# Altium footprint library ICs_JEDEC.PcbLib: 13 footprints
Each footprint in its own frame and in the unit in brackets; x right, y up, seen from the top. Pads: shape width x height; smd on the part's side, far side on the other; paste and mask are expansions set on the pad; w line width, h text height; cw(c..) or ccw(c..) is an arc to the next point about the centre after c.
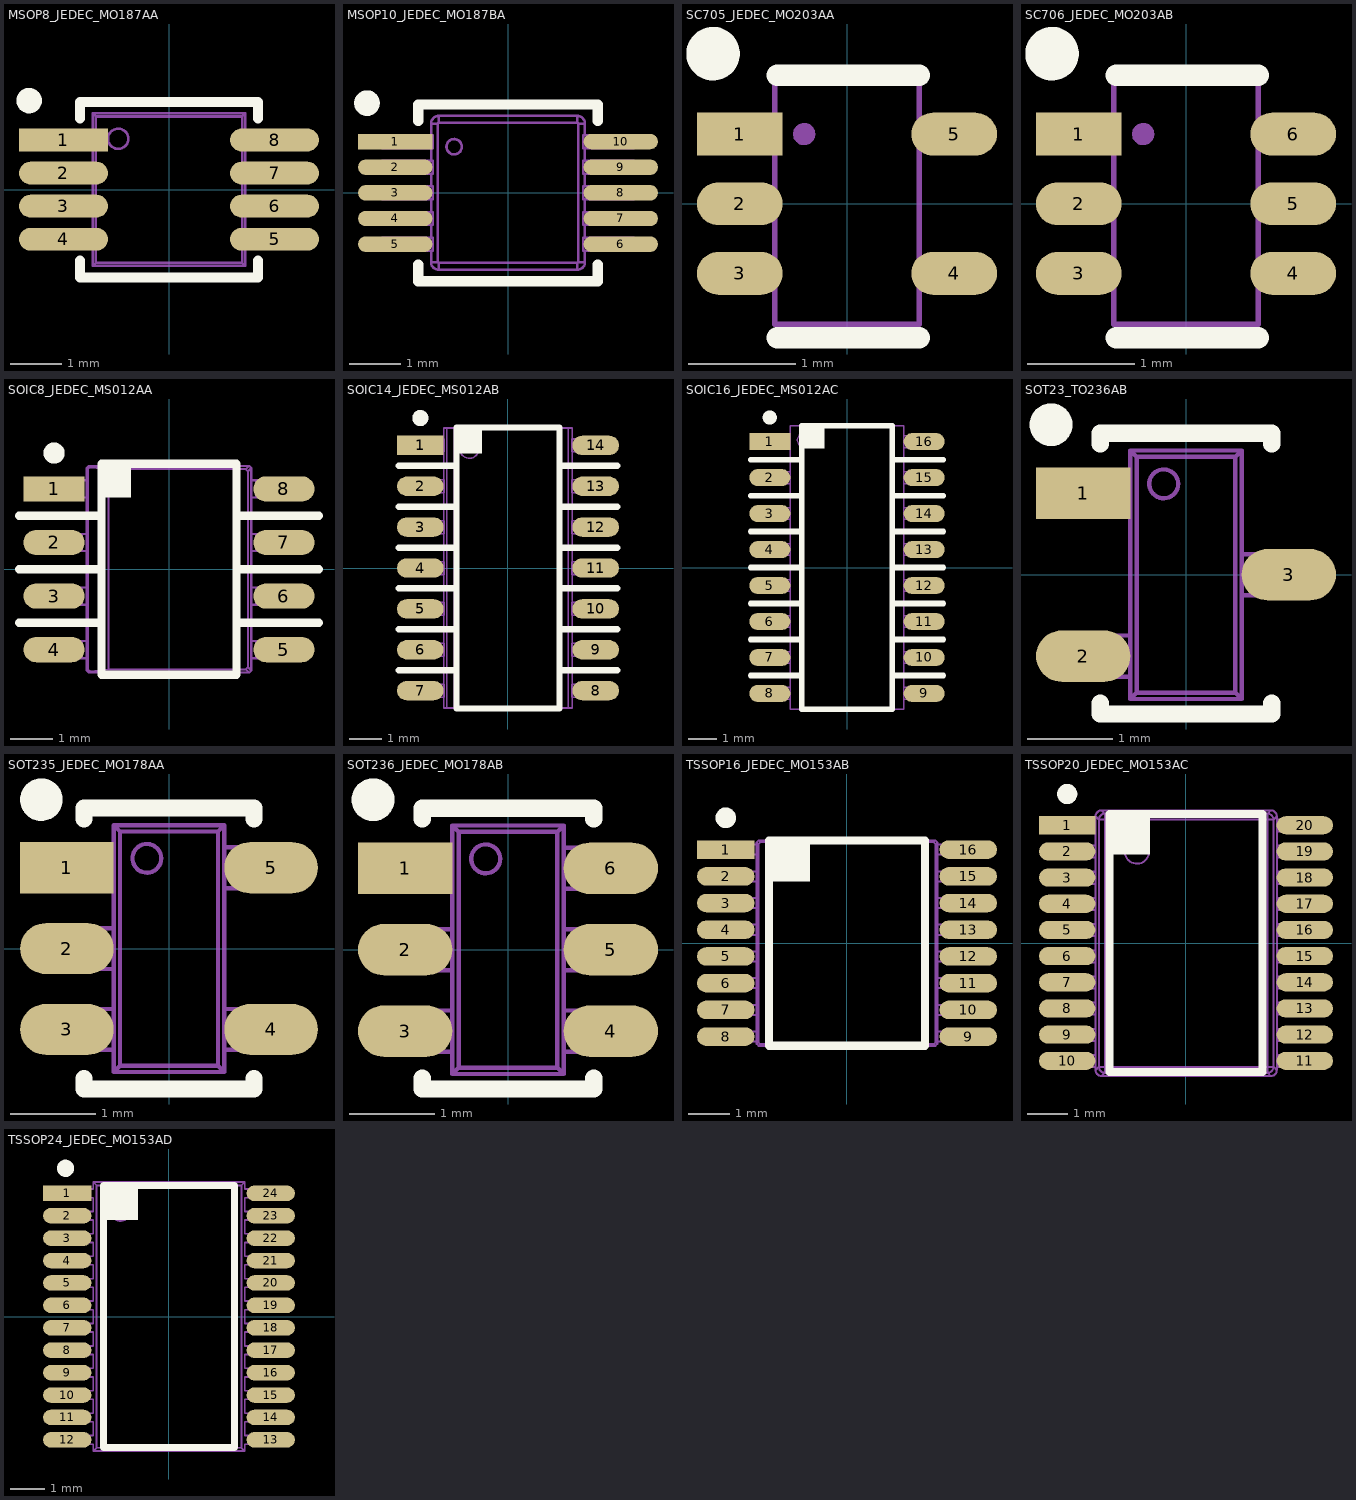
[diagram p0: the footprints below, top view; thin cyan lines are the x and y axes]

## MSOP8_JEDEC_MO187AA [mm] "MSOP, 8-Leads, Body 3.00x3.00mm, Pitch 0.65mm"
height 0.85
pads (8):
  rect 1.75x0.45 smd paste+0 mask+0.05: 1(-2.075,0.975)
  oval 1.75x0.45 smd paste+0 mask+0.05: 2(-2.075,0.325) 3(-2.075,-0.325) 4(-2.075,-0.975) 5(2.075,-0.975) 6(2.075,-0.325) 7(2.075,0.325) 8(2.075,0.975)
Top Overlay:
  circle w0.25: c-2.75,1.75 r0.125
  lines w0.2: -1.75,-1.4 -1.75,-1.725 1.75,-1.725 1.75,-1.4 ; -1.75,1.4 -1.75,1.725 1.75,1.725 1.75,1.4
Top Assembly:
  circle w0.05: c-1,1 r0.2
  lines w0.05: -2.1,-1.125 -2.5,-1.125 -2.5,-0.825 -2.1,-0.825 ; -2.1,-1.125 -2.1,-0.825 ; -2.1,-1.125 -2,-1.125 ; -2.1,-0.825 -2,-0.825 ; -2.1,-0.475 -2.5,-0.475 -2.5,-0.175 -2.1,-0.175 ; -2.1,-0.475 -2.1,-0.175 ; -2.1,-0.475 -2,-0.475 ; -2.1,-0.175 -2,-0.175 ; -2.1,0.175 -2.5,0.175 -2.5,0.475 -2.1,0.475 ; -2.1,0.175 -2.1,0.475 ; -2.1,0.175 -2,0.175 ; -2.1,0.475 -2,0.475 ; -2.1,0.825 -2.5,0.825 -2.5,1.125 -2.1,1.125 ; -2.1,0.825 -2.1,1.125 ; -2.1,0.825 -2,0.825 ; -2.1,1.125 -2,1.125 ; -2,-1.125 -2,-0.825 ; -2,-1.125 -1.8,-1.125 ; -2,-0.825 -1.8,-0.825 ; -2,-0.475 -2,-0.175 ; -2,-0.475 -1.8,-0.475 ; -2,-0.175 -1.8,-0.175 ; -2,0.175 -2,0.475 ; -2,0.175 -1.8,0.175 ; -2,0.475 -1.8,0.475 ; -2,0.825 -2,1.125 ; -2,0.825 -1.8,0.825 ; -2,1.125 -1.8,1.125 ; -1.8,-1.125 -1.5,-1.125 ; -1.8,-1.125 -1.8,-0.825 ; -1.8,-0.825 -1.5,-0.825 ; -1.8,-0.475 -1.5,-0.475 ; -1.8,-0.475 -1.8,-0.175 ; -1.8,-0.175 -1.5,-0.175 ; -1.8,0.175 -1.5,0.175 ; -1.8,0.175 -1.8,0.475 ; -1.8,0.475 -1.5,0.475 ; -1.8,0.825 -1.5,0.825 ; -1.8,0.825 -1.8,1.125 ; -1.8,1.125 -1.5,1.125 ; -1.5,-1.5 -1.5,-1.125 ; -1.5,-1.5 -1.438,-1.438 ; -1.5,-1.5 1.5,-1.5 ; -1.5,-1.125 -1.5,-0.825 ; -1.5,-0.825 -1.5,-0.475 ; -1.5,-0.475 -1.5,-0.175 ; -1.5,-0.175 -1.5,0.175 ; -1.5,0.175 -1.5,0.475 ; -1.5,0.475 -1.5,0.825 ; -1.5,0.825 -1.5,1.125 ; -1.5,1.125 -1.5,1.5 ; -1.5,1.5 -1.438,1.438 ; -1.5,1.5 1.5,1.5 ; -1.438,-1.438 -1.438,1.438 ; -1.438,-1.438 1.438,-1.438 ; -1.438,1.438 1.438,1.438 ; 1.438,-1.438 1.5,-1.5 ; 1.438,-1.438 1.438,1.438 ; 1.438,1.438 1.5,1.5 ; 1.5,-1.5 1.5,-1.125 ; 1.5,-1.125 1.5,-0.825 ; 1.5,-1.125 1.8,-1.125 ; 1.5,-0.825 1.5,-0.475 ; 1.5,-0.825 1.8,-0.825 ; 1.5,-0.475 1.5,-0.175 ; 1.5,-0.475 1.8,-0.475 ; 1.5,-0.175 1.8,-0.175 ; 1.5,-0.175 1.5,0.175 ; 1.5,0.175 1.5,0.475 ; 1.5,0.175 1.8,0.175 ; 1.5,0.475 1.5,0.825 ; 1.5,0.475 1.8,0.475 ; 1.5,0.825 1.5,1.125 ; 1.5,0.825 1.8,0.825 ; 1.5,1.125 1.5,1.5 ; 1.5,1.125 1.8,1.125 ; 1.8,-1.125 2,-1.125 ; 1.8,-1.125 1.8,-0.825 ; 1.8,-0.825 2,-0.825 ; 1.8,-0.475 2,-0.475 ; 1.8,-0.475 1.8,-0.175 ; 1.8,-0.175 2,-0.175 ; 1.8,0.175 2,0.175 ; 1.8,0.175 1.8,0.475 ; 1.8,0.475 2,0.475 ; 1.8,0.825 2,0.825 ; 1.8,0.825 1.8,1.125 ; 1.8,1.125 2,1.125 ; 2,-1.125 2,-0.825 ; 2,-1.125 2.1,-1.125 ; 2,-0.825 2.1,-0.825 ; 2,-0.475 2,-0.175 ; 2,-0.475 2.1,-0.475 ; 2,-0.175 2.1,-0.175 ; 2,0.175 2,0.475 ; 2,0.175 2.1,0.175 ; 2,0.475 2.1,0.475 ; 2,0.825 2,1.125 ; 2,0.825 2.1,0.825 ; 2,1.125 2.1,1.125 ; 2.1,-1.125 2.5,-1.125 2.5,-0.825 2.1,-0.825 ; 2.1,-1.125 2.1,-0.825 ; 2.1,-0.475 2.5,-0.475 2.5,-0.175 2.1,-0.175 ; 2.1,-0.475 2.1,-0.175 ; 2.1,0.175 2.5,0.175 2.5,0.475 2.1,0.475 ; 2.1,0.175 2.1,0.475 ; 2.1,0.825 2.5,0.825 2.5,1.125 2.1,1.125 ; 2.1,0.825 2.1,1.125
  text ".Designator" at -3.378,-0.339 h1.5
3D body "MSOP8_JEDEC_MO187AA.x_t": height 0.93, standoff 0, extent -2.5,-1.5 2.4,1.5

## MSOP10_JEDEC_MO187BA [mm] "MSOP, 10-Leads, Body 3.00x3.00mm, Pitch 0.5mm"
height 0.85
pads (10):
  rect 1.45x0.3 smd paste+0 mask+0.05: 1(-2.2,1)
  oval 1.45x0.3 smd paste+0 mask+0.05: 2(-2.2,0.5) 3(-2.2,0) 4(-2.2,-0.5) 5(-2.2,-1) 6(2.2,-1) 7(2.2,-0.5) 8(2.2,0) 9(2.2,0.5) 10(2.2,1)
Top Overlay:
  circle w0.25: c-2.75,1.75 r0.125
  lines w0.2: -1.75,-1.4 -1.75,-1.725 1.75,-1.725 1.75,-1.4 ; -1.75,1.4 -1.75,1.725 1.75,1.725 1.75,1.4
Top Assembly:
  drawing of 195 lines, arcs and shapes, not listed
  text ".Designator" at -3.378,-0.339 h1.5
3D body "MSOP10_JEDEC_MO187BA.x_t": height 0.93, standoff 0, extent -2.45,-1.5 2.45,1.5

## SC705_JEDEC_MO203AA [mm] "SC70, 5-Leads, Body 1.25x2.00mm, Pitch 0.65mm"
height 0.9
pads (5):
  rect 0.8x0.4 smd paste+0 mask+0.05: 1(-1,0.65)
  oval 0.8x0.4 smd paste+0 mask+0.05: 2(-1,0) 3(-1,-0.65) 4(1,-0.65) 5(1,0.65)
Top Overlay:
  circle w0.25: c-1.25,1.4 r0.125
  lines w0.2: -0.65,-1.25 0.675,-1.25 ; -0.65,1.2 0.675,1.2
Top Assembly:
  circle w0.05: c-0.4,0.65 r0.079
  region: -0.479,0.65 -0.479,0.634 -0.467,0.605 -0.445,0.583 -0.416,0.571 -0.4,0.571 -0.384,0.571 -0.355,0.583 -0.333,0.605 -0.321,0.634 -0.321,0.65 -0.321,0.666 -0.333,0.695 -0.355,0.717 -0.384,0.729 -0.4,0.729 -0.416,0.729 -0.445,0.717 -0.467,0.695 -0.479,0.666
  lines w0.05: -1.1,-0.775 -1.1,-0.525 ; -1.1,-0.125 -1.1,0.125 ; -1.1,0.525 -1.1,0.775 ; -0.8,-0.775 -0.8,-0.525 ; -0.8,-0.125 -0.8,0.125 ; -0.8,0.525 -0.8,0.775 ; -0.675,-0.775 -1.3,-0.775 -1.3,-0.525 -0.675,-0.525 ; -0.675,-0.125 -1.3,-0.125 -1.3,0.125 -0.675,0.125 ; -0.675,0.525 -1.3,0.525 -1.3,0.775 -0.675,0.775 ; 0.675,-0.775 1.3,-0.775 1.3,-0.525 0.675,-0.525 ; 0.675,0.525 1.3,0.525 1.3,0.775 0.675,0.775 ; 0.8,-0.775 0.8,-0.525 ; 0.8,0.525 0.8,0.775 ; 1.1,-0.775 1.1,-0.525 ; 1.1,0.525 1.1,0.775 ; -0.675,-1.125 0.675,-1.125 0.675,1.125 -0.675,1.125 -0.675,-1.125
  text ".Designator" at 0.226,-2.252 h1
3D body "SC705_JEDEC_MO203.x_t": height 0.95, standoff 0, extent -1.05,-1 1.05,1

## SC706_JEDEC_MO203AB [mm] "SC70, 6-Leads, Body 1.25x2.00mm, Pitch 0.65mm"
height 0.9
pads (6):
  rect 0.8x0.4 smd paste+0 mask+0.05: 1(-1,0.65)
  oval 0.8x0.4 smd paste+0 mask+0.05: 2(-1,0) 3(-1,-0.65) 4(1,-0.65) 5(1,0) 6(1,0.65)
Top Overlay:
  circle w0.25: c-1.25,1.4 r0.125
  lines w0.2: -0.65,-1.25 0.675,-1.25 ; -0.65,1.2 0.675,1.2
Top Assembly:
  circle w0.05: c-0.4,0.65 r0.079
  region: -0.479,0.65 -0.479,0.634 -0.467,0.605 -0.445,0.583 -0.416,0.571 -0.4,0.571 -0.384,0.571 -0.355,0.583 -0.333,0.605 -0.321,0.634 -0.321,0.65 -0.321,0.666 -0.333,0.695 -0.355,0.717 -0.384,0.729 -0.4,0.729 -0.416,0.729 -0.445,0.717 -0.467,0.695 -0.479,0.666
  lines w0.05: -1.1,-0.775 -1.1,-0.525 ; -1.1,-0.125 -1.1,0.125 ; -1.1,0.525 -1.1,0.775 ; -0.8,-0.775 -0.8,-0.525 ; -0.8,-0.125 -0.8,0.125 ; -0.8,0.525 -0.8,0.775 ; -0.675,-0.775 -1.3,-0.775 -1.3,-0.525 -0.675,-0.525 ; -0.675,-0.125 -1.3,-0.125 -1.3,0.125 -0.675,0.125 ; -0.675,0.525 -1.3,0.525 -1.3,0.775 -0.675,0.775 ; 0.675,-0.775 1.3,-0.775 1.3,-0.525 0.675,-0.525 ; 0.675,-0.125 1.3,-0.125 1.3,0.125 0.675,0.125 ; 0.675,0.525 1.3,0.525 1.3,0.775 0.675,0.775 ; 0.8,-0.775 0.8,-0.525 ; 0.8,-0.125 0.8,0.125 ; 0.8,0.525 0.8,0.775 ; 1.1,-0.775 1.1,-0.525 ; 1.1,-0.125 1.1,0.125 ; 1.1,0.525 1.1,0.775 ; -0.675,-1.125 -0.675,1.125 0.675,1.125 0.675,-1.125 -0.675,-1.125
  text ".Designator" at 0.226,-2.252 h1
3D body "SC706_JEDEC_MO203.x_t": height 0.95, standoff 0, extent -1.05,-1 1.05,1

## SOIC8_JEDEC_MS012AA [mm] "SOIC, 8-Leads, Body 3.90x4.90mm, Pitch 1.27mm"
height 1.75
pads (8):
  rect 1.45x0.6 smd paste+0 mask+0.05: 1(-2.725,1.905)
  oval 1.45x0.6 smd paste+0 mask+0.05: 2(-2.725,0.635) 3(-2.725,-0.635) 4(-2.725,-1.905) 5(2.725,-1.905) 6(2.725,-0.635) 7(2.725,0.635) 8(2.725,1.905)
Top Overlay:
  circle w0.25: c-2.725,2.755 r0.125
  rectangle: -1.7,1.7 -0.9,2.5
  lines w0.2: -3.556,-1.27 -1.601,-1.27 ; -3.556,0 -1.601,0 ; -3.556,1.27 -1.601,1.27 ; 1.601,-1.27 3.556,-1.27 ; 1.601,0 3.556,0 ; 1.601,1.27 3.556,1.27 ; -1.6,-2.5 -1.6,2.5 1.6,2.5 1.6,-2.5 -1.6,-2.5
Top Assembly:
  drawing of 155 lines, arcs and shapes, not listed
  text ".Designator" at 0.453,-4.511 h2
3D body "SOIC8_JEDEC_MS012.x_t": height 1.43, standoff 0, extent -3,-2.45 3,2.45

## SOIC14_JEDEC_MS012AB [mm] "SOIC, 14-Leads, Body 3.90x8.65mm, Pitch 1.27mm"
height 1.75
pads (14):
  rect 1.45x0.6 smd paste+0 mask+0.05: 1(-2.725,3.81)
  oval 1.45x0.6 smd paste+0 mask+0.05: 2(-2.725,2.54) 3(-2.725,1.27) 4(-2.725,0) 5(-2.725,-1.27) 6(-2.725,-2.54) 7(-2.725,-3.81) 8(2.725,-3.81) 9(2.725,-2.54) 10(2.725,-1.27) 11(2.725,0) 12(2.725,1.27) 13(2.725,2.54) 14(2.725,3.81)
Top Overlay:
  circle w0.25: c-2.725,4.66 r0.125
  rectangle: -1.6,3.565 -0.8,4.365
  lines w0.2: -3.4,-3.175 -1.6,-3.175 ; -3.4,-1.905 -1.6,-1.905 ; -3.4,-0.635 -1.6,-0.635 ; -3.4,0.635 -1.6,0.635 ; -3.4,1.905 -1.6,1.905 ; -3.4,3.175 -1.6,3.175 ; -1.6,-4.365 1.6,-4.365 ; -1.6,-4.35 -1.6,4.365 1.6,4.365 1.6,-4.35 ; 1.6,-3.175 3.4,-3.175 ; 1.6,-1.905 3.4,-1.905 ; 1.6,-0.635 3.4,-0.635 ; 1.6,0.635 3.4,0.635 ; 1.6,1.905 3.4,1.905 ; 1.6,3.175 3.4,3.175
Top Assembly:
  drawing of 252 lines, arcs and shapes, not listed
  text ".Designator" at 0.453,-4.511 h2
3D body "SOIC14_JEDEC_MS012.x_t": height 1.43, standoff 0, extent -3,-4.325 3,4.325

## SOIC16_JEDEC_MS012AC [mm] "SOIC, 16-Leads, Body 3.90x9.90mm, Pitch 1.27mm"
height 1.75
pads (16):
  rect 1.45x0.6 smd paste+0 mask+0.05: 1(-2.725,4.445)
  oval 1.45x0.6 smd paste+0 mask+0.05: 2(-2.725,3.175) 3(-2.725,1.905) 4(-2.725,0.635) 5(-2.725,-0.635) 6(-2.725,-1.905) 7(-2.725,-3.175) 8(-2.725,-4.445) 9(2.725,-4.445) 10(2.725,-3.175) 11(2.725,-1.905) 12(2.725,-0.635) 13(2.725,0.635) 14(2.725,1.905) 15(2.725,3.175) 16(2.725,4.445)
Top Overlay:
  circle w0.25: c-2.725,5.295 r0.125
  rectangle: -1.6,4.2 -0.8,5
  lines w0.2: -3.4,-3.81 -1.6,-3.81 ; -3.4,-2.54 -1.6,-2.54 ; -3.4,-1.27 -1.6,-1.27 ; -3.4,0 -1.6,0 ; -3.4,1.27 -1.6,1.27 ; -3.4,2.54 -1.6,2.54 ; -3.4,3.81 -1.6,3.81 ; 1.6,-3.81 3.4,-3.81 ; 1.6,-2.54 3.4,-2.54 ; 1.6,-1.27 3.4,-1.27 ; 1.6,0 3.4,0 ; 1.6,1.27 3.4,1.27 ; 1.6,2.54 3.4,2.54 ; 1.6,3.81 3.4,3.81 ; -1.6,-5 1.6,-5 1.6,5 -1.6,5 -1.6,-5
Top Assembly:
  drawing of 213 lines, arcs and shapes, not listed
  text ".Designator" at 0.453,-4.511 h2
3D body "SOIC16_JEDEC_MS012.x_t": height 1.43, standoff 0, extent -3,-4.95 3,4.95

## SOT23_TO236AB [mm] "TO236AB (SOT23-3), 3-Leads, Body 1.30x2.90mm, Pitch 0.95mm"
height 0.95
pads (3):
  rect 1.1x0.6 smd paste+0 mask+0.05: 1(-1.2,0.95)
  oval 1.1x0.6 smd paste+0 mask+0.05: 2(-1.2,-0.95) 3(1.2,0)
Top Overlay:
  circle w0.25: c-1.575,1.75 r0.125
  lines w0.2: -1,-1.5 -1,-1.625 1,-1.625 1,-1.5 ; -1,1.525 -1,1.65 1,1.65 1,1.525
Top Assembly:
  circle w0.05: c-0.26,1.06 r0.169
  lines w0.05: -1.19,-1.19 -1.099,-1.19 ; -1.19,-1.19 -1.4,-1.19 -1.4,-0.71 -1.19,-0.71 ; -1.19,-1.19 -1.19,-0.71 ; -1.19,-0.71 -1.099,-0.71 ; -1.19,0.71 -1.099,0.71 ; -1.19,0.71 -1.4,0.71 -1.4,1.19 -1.19,1.19 ; -1.19,0.71 -1.19,1.19 ; -1.19,1.19 -1.099,1.19 ; -1.099,-1.19 -1.074,-1.19 ; -1.099,-1.19 -1.099,-0.71 ; -1.099,-0.71 -1.074,-0.71 ; -1.099,0.71 -1.074,0.71 ; -1.099,0.71 -1.099,1.19 ; -1.099,1.19 -1.074,1.19 ; -1.074,-1.19 -0.825,-1.19 ; -1.074,-1.19 -1.074,-0.71 ; -1.074,-0.71 -0.825,-0.71 ; -1.074,0.71 -0.825,0.71 ; -1.074,0.71 -1.074,1.19 ; -1.074,1.19 -0.825,1.19 ; -0.825,-1.19 -0.65,-1.19 ; -0.825,-1.19 -0.825,-0.71 ; -0.825,-0.71 -0.65,-0.71 ; -0.825,0.71 -0.65,0.71 ; -0.825,0.71 -0.825,1.19 ; -0.825,1.19 -0.65,1.19 ; -0.65,-1.45 -0.576,-1.376 ; -0.65,-1.45 -0.65,-1.19 ; -0.65,-1.45 0.65,-1.45 ; -0.65,-1.19 -0.65,-0.71 ; -0.65,-0.71 -0.65,0.71 ; -0.65,0.71 -0.65,1.19 ; -0.65,1.19 -0.65,1.45 ; -0.65,1.45 0.65,1.45 ; -0.65,1.45 -0.576,1.376 ; -0.576,-1.376 -0.576,1.376 ; -0.576,-1.376 0.576,-1.376 ; -0.576,1.376 0.576,1.376 ; 0.576,-1.376 0.576,1.376 ; 0.576,-1.376 0.65,-1.45 ; 0.576,1.376 0.65,1.45 ; 0.65,-1.45 0.65,-0.24 ; 0.65,-0.24 0.65,0.24 ; 0.65,-0.24 0.825,-0.24 ; 0.65,0.24 0.65,1.45 ; 0.65,0.24 0.825,0.24 ; 0.825,-0.24 1.074,-0.24 ; 0.825,-0.24 0.825,0.24 ; 0.825,0.24 1.074,0.24 ; 1.074,-0.24 1.099,-0.24 ; 1.074,-0.24 1.074,0.24 ; 1.074,0.24 1.099,0.24 ; 1.099,-0.24 1.19,-0.24 ; 1.099,-0.24 1.099,0.24 ; 1.099,0.24 1.19,0.24 ; 1.19,-0.24 1.4,-0.24 1.4,0.24 1.19,0.24 ; 1.19,-0.24 1.19,0.24
  text ".Designator" at 0.226,-2.252 h1
3D body "SOT23_TO236AB.x_t": height 1.05, standoff 0, extent -1.32,-1.45 1.4,1.45

## SOT235_JEDEC_MO178AA [mm] "SOT23, 5-Leads, Body 2.90x2.80mm, Pitch 0.95mm"
height 1.15
pads (5):
  rect 1.1x0.6 smd paste+0 mask+0.05: 1(-1.2,0.95)
  oval 1.1x0.6 smd paste+0 mask+0.05: 2(-1.2,0) 3(-1.2,-0.95) 4(1.2,-0.95) 5(1.2,0.95)
Top Overlay:
  circle w0.25: c-1.5,1.75 r0.125
  lines w0.2: -1,-1.525 -1,-1.65 1,-1.65 1,-1.525 ; -1,1.525 -1,1.65 1,1.65 1,1.525
Top Assembly:
  circle w0.05: c-0.26,1.06 r0.169
  lines w0.05: -0.65,-0.24 -0.825,-0.24 ; -0.65,0.24 -0.825,0.24 ; 0.65,-1.19 0.825,-1.19 ; 0.65,-0.71 0.825,-0.71 ; 0.65,0.71 0.825,0.71 ; 0.65,1.19 0.825,1.19 ; -1.19,-1.19 -1.19,-0.71 ; -1.19,-1.19 -1.4,-1.19 -1.4,-0.71 -1.19,-0.71 ; -1.19,-1.19 -1.099,-1.19 ; -1.19,-0.71 -1.099,-0.71 ; -1.19,-0.24 -1.099,-0.24 ; -1.19,-0.24 -1.4,-0.24 -1.4,0.24 -1.19,0.24 ; -1.19,-0.24 -1.19,0.24 ; -1.19,0.24 -1.099,0.24 ; -1.19,0.71 -1.19,1.19 ; -1.19,0.71 -1.4,0.71 -1.4,1.19 -1.19,1.19 ; -1.19,0.71 -1.099,0.71 ; -1.19,1.19 -1.099,1.19 ; -1.099,-1.19 -1.099,-0.71 ; -1.099,-1.19 -1.074,-1.19 ; -1.099,-0.71 -1.074,-0.71 ; -1.099,-0.24 -1.074,-0.24 ; -1.099,-0.24 -1.099,0.24 ; -1.099,0.24 -1.074,0.24 ; -1.099,0.71 -1.099,1.19 ; -1.099,0.71 -1.074,0.71 ; -1.099,1.19 -1.074,1.19 ; -1.074,-1.19 -1.074,-0.71 ; -1.074,-1.19 -0.825,-1.19 ; -1.074,-0.71 -0.825,-0.71 ; -1.074,-0.24 -0.825,-0.24 ; -1.074,-0.24 -1.074,0.24 ; -1.074,0.24 -0.825,0.24 ; -1.074,0.71 -1.074,1.19 ; -1.074,0.71 -0.825,0.71 ; -1.074,1.19 -0.825,1.19 ; -0.825,-1.19 -0.825,-0.71 ; -0.825,-1.19 -0.65,-1.19 ; -0.825,-0.71 -0.65,-0.71 ; -0.825,-0.24 -0.825,0.24 ; -0.825,0.71 -0.825,1.19 ; -0.825,0.71 -0.65,0.71 ; -0.825,1.19 -0.65,1.19 ; -0.65,-1.45 0.65,-1.45 ; -0.65,-1.45 -0.65,-1.19 ; -0.65,-1.45 -0.576,-1.376 ; -0.65,-1.19 -0.65,-0.71 ; -0.65,-0.71 -0.65,0.71 ; -0.65,0.71 -0.65,1.19 ; -0.65,1.19 -0.65,1.45 ; -0.65,1.45 -0.576,1.376 ; -0.65,1.45 0.65,1.45 ; -0.576,-1.376 0.576,-1.376 ; -0.576,-1.376 -0.576,1.376 ; -0.576,1.376 0.576,1.376 ; 0.576,-1.376 0.65,-1.45 ; 0.576,-1.376 0.576,1.376 ; 0.576,1.376 0.65,1.45 ; 0.65,-1.45 0.65,-0.24 0.65,0.24 0.65,1.45 ; 0.825,-1.19 1.074,-1.19 ; 0.825,-1.19 0.825,-0.71 ; 0.825,-0.71 1.074,-0.71 ; 0.825,0.71 1.074,0.71 ; 0.825,0.71 0.825,1.19 ; 0.825,1.19 1.074,1.19 ; 1.074,-1.19 1.099,-1.19 ; 1.074,-1.19 1.074,-0.71 ; 1.074,-0.71 1.099,-0.71 ; 1.074,0.71 1.099,0.71 ; 1.074,0.71 1.074,1.19 ; 1.074,1.19 1.099,1.19 ; 1.099,-1.19 1.19,-1.19 ; 1.099,-1.19 1.099,-0.71 ; 1.099,-0.71 1.19,-0.71 ; 1.099,0.71 1.19,0.71 ; 1.099,0.71 1.099,1.19 ; 1.099,1.19 1.19,1.19 ; 1.19,-1.19 1.4,-1.19 1.4,-0.71 1.19,-0.71 ; 1.19,-1.19 1.19,-0.71 ; 1.19,0.71 1.4,0.71 1.4,1.19 1.19,1.19 ; 1.19,0.71 1.19,1.19
  text ".Designator" at 0.226,-2.252 h1
3D body "SOT235_JEDEC_MO178.x_t": height 1.2, standoff 0, extent -1.4,-1.45 1.4,1.45

## SOT236_JEDEC_MO178AB [mm] "SOT23, 6-Leads, Body 2.90x2.80mm, Pitch 0.95mm"
height 1.15
pads (6):
  rect 1.1x0.6 smd paste+0 mask+0.05: 1(-1.2,0.95)
  oval 1.1x0.6 smd paste+0 mask+0.05: 2(-1.2,0) 3(-1.2,-0.95) 4(1.2,-0.95) 5(1.2,0) 6(1.2,0.95)
Top Overlay:
  circle w0.25: c-1.575,1.75 r0.125
  lines w0.2: -1,-1.5 -1,-1.625 1,-1.625 1,-1.5 ; -1,1.525 -1,1.65 1,1.65 1,1.525
Top Assembly:
  circle w0.05: c-0.26,1.06 r0.169
  lines w0.05: -0.65,-0.24 -0.825,-0.24 ; -0.65,0.24 -0.825,0.24 ; 0.65,-1.19 0.825,-1.19 ; 0.65,-0.71 0.825,-0.71 ; 0.65,0.71 0.825,0.71 ; 0.65,1.19 0.825,1.19 ; -1.19,-1.19 -1.19,-0.71 ; -1.19,-1.19 -1.4,-1.19 -1.4,-0.71 -1.19,-0.71 ; -1.19,-1.19 -1.099,-1.19 ; -1.19,-0.71 -1.099,-0.71 ; -1.19,-0.24 -1.099,-0.24 ; -1.19,-0.24 -1.4,-0.24 -1.4,0.24 -1.19,0.24 ; -1.19,-0.24 -1.19,0.24 ; -1.19,0.24 -1.099,0.24 ; -1.19,0.71 -1.19,1.19 ; -1.19,0.71 -1.4,0.71 -1.4,1.19 -1.19,1.19 ; -1.19,0.71 -1.099,0.71 ; -1.19,1.19 -1.099,1.19 ; -1.099,-1.19 -1.099,-0.71 ; -1.099,-1.19 -1.074,-1.19 ; -1.099,-0.71 -1.074,-0.71 ; -1.099,-0.24 -1.074,-0.24 ; -1.099,-0.24 -1.099,0.24 ; -1.099,0.24 -1.074,0.24 ; -1.099,0.71 -1.099,1.19 ; -1.099,0.71 -1.074,0.71 ; -1.099,1.19 -1.074,1.19 ; -1.074,-1.19 -1.074,-0.71 ; -1.074,-1.19 -0.825,-1.19 ; -1.074,-0.71 -0.825,-0.71 ; -1.074,-0.24 -0.825,-0.24 ; -1.074,-0.24 -1.074,0.24 ; -1.074,0.24 -0.825,0.24 ; -1.074,0.71 -1.074,1.19 ; -1.074,0.71 -0.825,0.71 ; -1.074,1.19 -0.825,1.19 ; -0.825,-1.19 -0.825,-0.71 ; -0.825,-1.19 -0.65,-1.19 ; -0.825,-0.71 -0.65,-0.71 ; -0.825,-0.24 -0.825,0.24 ; -0.825,0.71 -0.825,1.19 ; -0.825,0.71 -0.65,0.71 ; -0.825,1.19 -0.65,1.19 ; -0.65,-1.45 0.65,-1.45 ; -0.65,-1.45 -0.65,-1.19 ; -0.65,-1.45 -0.576,-1.376 ; -0.65,-1.19 -0.65,-0.71 ; -0.65,-0.71 -0.65,0.71 ; -0.65,0.71 -0.65,1.19 ; -0.65,1.19 -0.65,1.45 ; -0.65,1.45 -0.576,1.376 ; -0.65,1.45 0.65,1.45 ; -0.576,-1.376 0.576,-1.376 ; -0.576,-1.376 -0.576,1.376 ; -0.576,1.376 0.576,1.376 ; 0.576,-1.376 0.65,-1.45 ; 0.576,-1.376 0.576,1.376 ; 0.576,1.376 0.65,1.45 ; 0.65,-1.45 0.65,-0.24 ; 0.65,-0.24 0.825,-0.24 ; 0.65,-0.24 0.65,0.24 ; 0.65,0.24 0.825,0.24 ; 0.65,0.24 0.65,1.45 ; 0.825,-1.19 1.074,-1.19 ; 0.825,-1.19 0.825,-0.71 ; 0.825,-0.71 1.074,-0.71 ; 0.825,-0.24 0.825,0.24 ; 0.825,-0.24 1.074,-0.24 ; 0.825,0.24 1.074,0.24 ; 0.825,0.71 1.074,0.71 ; 0.825,0.71 0.825,1.19 ; 0.825,1.19 1.074,1.19 ; 1.074,-1.19 1.099,-1.19 ; 1.074,-1.19 1.074,-0.71 ; 1.074,-0.71 1.099,-0.71 ; 1.074,-0.24 1.074,0.24 ; 1.074,-0.24 1.099,-0.24 ; 1.074,0.24 1.099,0.24 ; 1.074,0.71 1.099,0.71 ; 1.074,0.71 1.074,1.19 ; 1.074,1.19 1.099,1.19 ; 1.099,-1.19 1.19,-1.19 ; 1.099,-1.19 1.099,-0.71 ; 1.099,-0.71 1.19,-0.71 ; 1.099,-0.24 1.099,0.24 ; 1.099,-0.24 1.19,-0.24 ; 1.099,0.24 1.19,0.24 ; 1.099,0.71 1.19,0.71 ; 1.099,0.71 1.099,1.19 ; 1.099,1.19 1.19,1.19 ; 1.19,-1.19 1.4,-1.19 1.4,-0.71 1.19,-0.71 ; 1.19,-1.19 1.19,-0.71 ; 1.19,-0.24 1.19,0.24 ; 1.19,-0.24 1.4,-0.24 1.4,0.24 1.19,0.24 ; 1.19,0.71 1.4,0.71 1.4,1.19 1.19,1.19 ; 1.19,0.71 1.19,1.19
  text ".Designator" at 0.226,-2.252 h1
3D body "SOT236_JEDEC_MO178.x_t": height 1.2, standoff 0, extent -1.375,-1.45 1.425,1.45

## TSSOP16_JEDEC_MO153AB [mm] "TSSOP, 16-Leads, Body 5.0x4.40mm, Pitch 0.65mm"
height 1.2
pads (16):
  rect 1.4x0.45 smd paste+0 mask+0.05: 1(-2.95,2.275)
  oval 1.4x0.45 smd paste+0 mask+0.05: 2(-2.95,1.625) 3(-2.95,0.975) 4(-2.95,0.325) 5(-2.95,-0.325) 6(-2.95,-0.975) 7(-2.95,-1.625) 8(-2.95,-2.275) 9(2.95,-2.275) 10(2.95,-1.625) 11(2.95,-0.975) 12(2.95,-0.325) 13(2.95,0.325) 14(2.95,0.975) 15(2.95,1.625) 16(2.95,2.275)
Top Overlay:
  circle w0.25: c-2.95,3.05 r0.125
  region: -0.9,2.5 -1.9,2.5 -1.9,1.5 -0.9,1.5
  lines w0.2: -1.9,-2.5 1.9,-2.5 1.9,2.5 -1.9,2.5 -1.9,-2.5
Top Assembly:
  drawing of 273 lines, arcs and shapes, not listed
  text ".Designator" at 0.453,-4.511 h2
3D body "TSSOP16_JEDEC_MO153.x_t": height 1.2, standoff 0, extent -3.2,-2.5 3.2,2.5

## TSSOP20_JEDEC_MO153AC [mm] "TSSOP, 20-Leads, Body 6.50x4.40mm, Pitch 0.65mm"
height 1.2
pads (20):
  rect 1.4x0.45 smd paste+0 mask+0.05: 1(-2.95,2.925)
  oval 1.4x0.45 smd paste+0 mask+0.05: 2(-2.95,2.275) 3(-2.95,1.625) 4(-2.95,0.975) 5(-2.95,0.325) 6(-2.95,-0.325) 7(-2.95,-0.975) 8(-2.95,-1.625) 9(-2.95,-2.275) 10(-2.95,-2.925) 11(2.95,-2.925) 12(2.95,-2.275) 13(2.95,-1.625) 14(2.95,-0.975) 15(2.95,-0.325) 16(2.95,0.325) 17(2.95,0.975) 18(2.95,1.625) 19(2.95,2.275) 20(2.95,2.925)
Top Overlay:
  circle w0.25: c-2.95,3.7 r0.125
  region: -0.9,3.2 -1.9,3.2 -1.9,2.2 -0.9,2.2
  lines w0.2: -1.9,-3.2 -1.9,3.2 1.9,3.2 1.9,-3.2 -1.9,-3.2
Top Assembly:
  drawing of 315 lines, arcs and shapes, not listed
  text ".Designator" at 0.339,-3.378 h1.5
3D body "TSSOP20_JEDEC_MO153.x_t": height 1.2, standoff 0, extent -3.2,-3.25 3.2,3.25

## TSSOP24_JEDEC_MO153AD [mm] "TSSOP, 24-Leads, Body 7.8.0x4.40mm, Pitch 0.65mm"
height 1.2
pads (24):
  rect 1.4x0.45 smd paste+0 mask+0.05: 1(-2.95,3.575)
  oval 1.4x0.45 smd paste+0 mask+0.05: 2(-2.95,2.925) 3(-2.95,2.275) 4(-2.95,1.625) 5(-2.95,0.975) 6(-2.95,0.325) 7(-2.95,-0.325) 8(-2.95,-0.975) 9(-2.95,-1.625) 10(-2.95,-2.275) 11(-2.95,-2.925) 12(-2.95,-3.575) 13(2.95,-3.575) 14(2.95,-2.925) 15(2.95,-2.275) 16(2.95,-1.625) 17(2.95,-0.975) 18(2.95,-0.325) 19(2.95,0.325) 20(2.95,0.975) 21(2.95,1.625) 22(2.95,2.275) 23(2.95,2.925) 24(2.95,3.575)
Top Overlay:
  circle w0.25: c-3,4.3 r0.125
  region: -0.9,3.8 -1.9,3.8 -1.9,2.8 -0.9,2.8
  lines w0.2: -1.9,-3.8 1.9,-3.8 1.9,3.8 -1.9,3.8 -1.9,-3.8
Top Assembly:
  drawing of 397 lines, arcs and shapes, not listed
  text ".Designator" at 0.453,-4.511 h2
3D body "TSSOP24_JEDEC_MO153.x_t": height 1.2, standoff 0, extent -3.2,-3.9 3.2,3.9